# Altium footprint library custom.PcbLib: 330 footprints (part 15 of 21)
Each footprint in its own frame and in the unit in brackets; x right, y up, seen from the top. Pads: shape width x height; smd on the part's side, far side on the other; paste and mask are expansions set on the pad; w line width, h text height; cw(c..) or ccw(c..) is an arc to the next point about the centre after c.
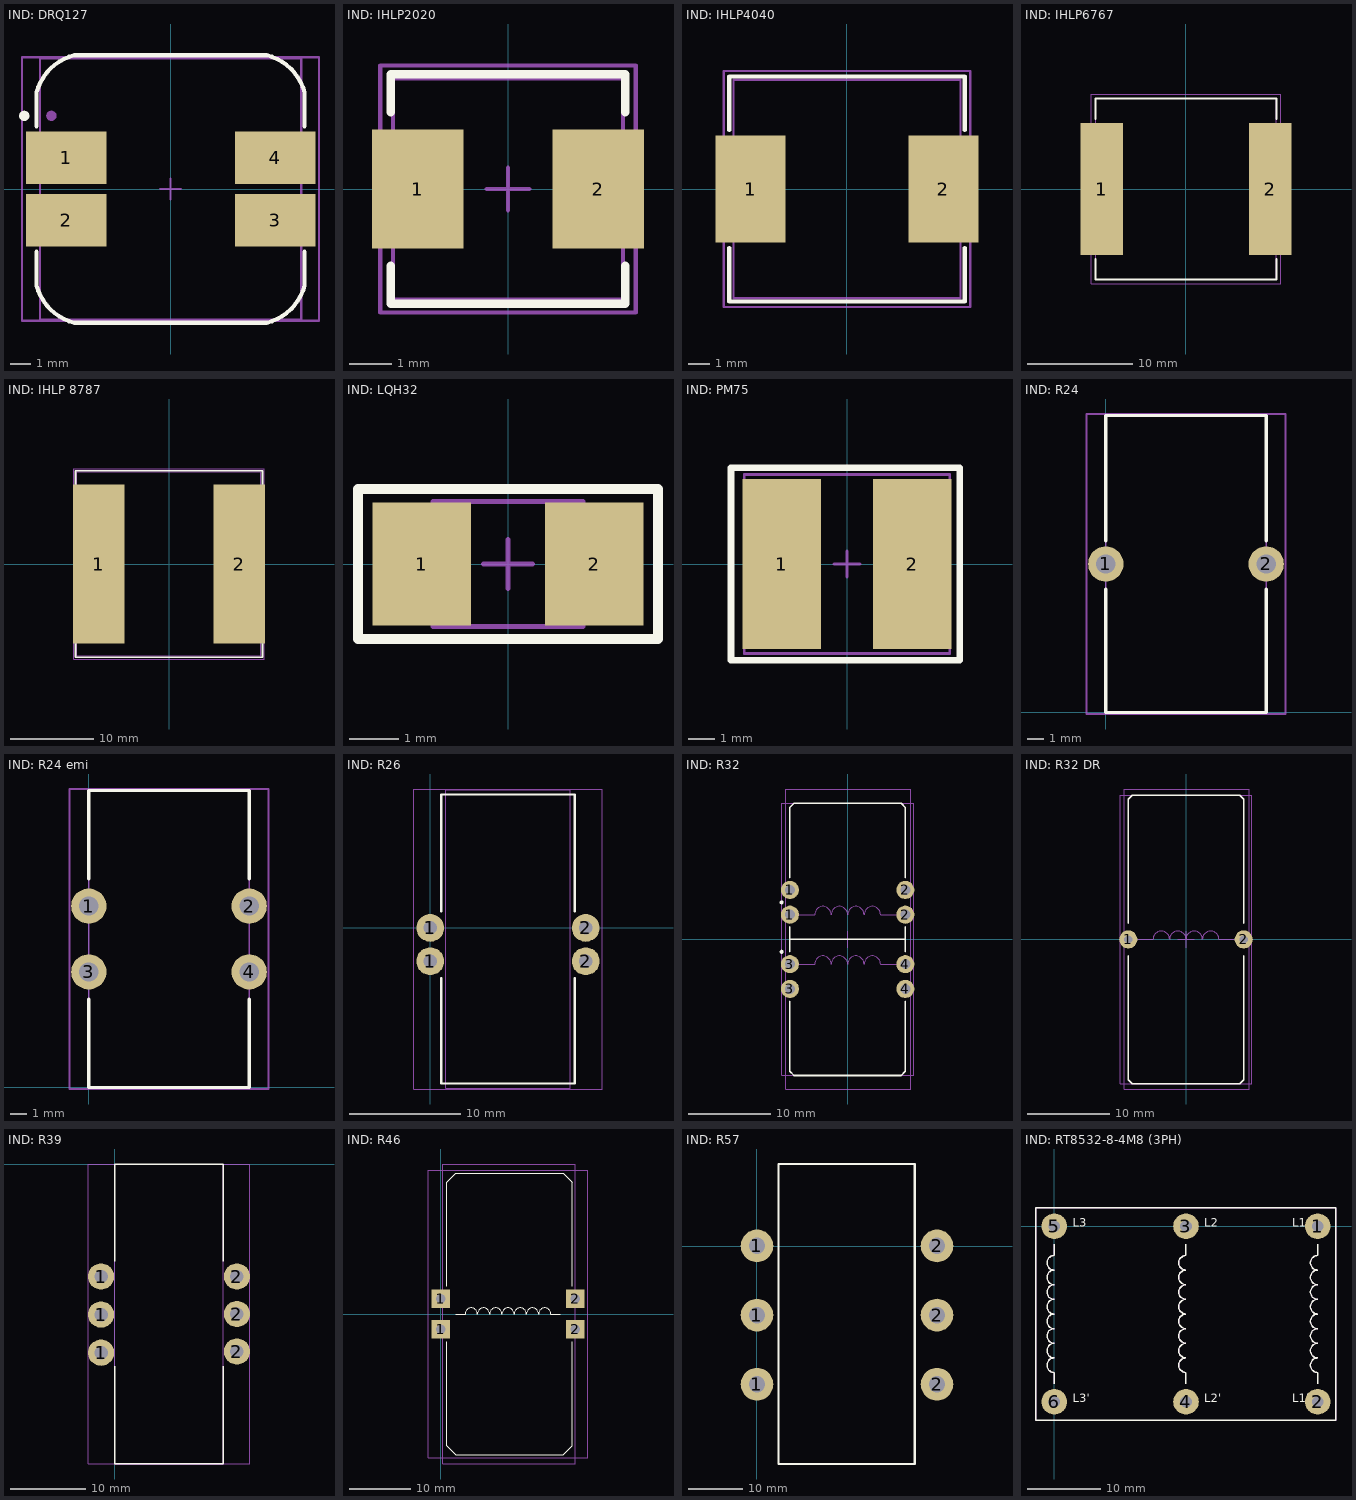
[diagram p14: the footprints below, top view; thin cyan lines are the x and y axes]

## IND: DRQ127 [mm] "Inductor"
height 5.1
pads (6):
  rect 3.85x2.5 smd: 1(-5,1.5) 2(-5,-1.5) 3(5,-1.5) 4(5,1.5)
  round 0.5 on Top Overlay: ""(-7,3.5)
  round 0.5 on Mech1: ""(-5.7,3.5)
Top Overlay:
  lines w0.2: -6.408,-3 -6.408,-4.625 ccw(c-3.994,-3.975) -4.6,-6.4 ; -6.408,3 -6.408,4.625 cw(c-3.994,3.975) -4.6,6.4 ; -4.606,-6.4 4.6,-6.4 ccw(c3.994,-3.975) 6.408,-4.625 6.408,-3 ; -4.606,6.4 4.6,6.4 cw(c3.994,3.975) 6.408,4.625 6.408,3
Top Assy:
  lines w0.1: -6.25,-6.25 -6.25,6.25 6.25,6.25 6.25,-6.25 -6.25,-6.25
Size Area:
  lines w0.1: -0.5,0 0.5,0 ; 0,-0.5 0,0.5 ; -7.1,-6.3 7.1,-6.3 7.1,6.3 -7.1,6.3 -7.1,-6.3
3D body "SW3dPS-DRQ127_12.5x12.5.STEP": height 8, standoff 0, extent -6.25,-6.25 6.25,6.25

## IND: IHLP2020 [mm] "SMD inductor, 5.2x5.2x3 mm"
height 3
pads (2):
  rect 2.15x2.8 smd: 1(-2.125,0) 2(2.125,0)
Top Overlay:
  lines w0.2: -2.75,-1.8 -2.75,-2.7 2.75,-2.7 2.75,-1.8 ; -2.75,1.8 -2.75,2.7 2.75,2.7 2.75,1.8
Top Assy:
  lines w0.1: -2.7,-2.6 2.7,-2.6 2.7,2.6 -2.7,2.6 -2.7,-2.6
Size Area:
  lines w0.1: -0.5,0 0.5,0 ; 0,-0.5 0,0.5 ; -3,-2.9 3,-2.9 3,2.9 -3,2.9 -3,-2.9
3D body "IHLP-2020.stp": height 2.89, standoff 0.03, extent -2.725,-2.571 2.725,2.575

## IND: IHLP4040 [mm] "SMD inductor, 10.3x10.8x4 mm"
height 4
pads (2):
  rect 3.25x5 smd: 1(-4.5,0) 2(4.5,0)
Top Overlay:
  lines w0.2: -5.5,-2.75 -5.5,-5.25 5.5,-5.25 5.5,-2.75 ; -5.5,2.75 -5.5,5.25 5.5,5.25 5.5,2.75
Top Assy:
  lines w0.1: -5.3,-5.1 -5.3,5.1 5.3,5.1 5.3,-5.1 -5.3,-5.1
Size Area:
  lines w0.1: -5.75,-5.5 -5.75,5.5 5.75,5.5 5.75,-5.5 -5.75,-5.5
3D body "IHLP-4040.stp": height 3.94, standoff 0.06, extent -5.311,-5.1 5.311,5.116

## IND: IHLP6767 [mm] "SMT inductor, 17x17x7 mm"
height 7
pads (2):
  rect 4x12.5 smd: 1(-8,0) 2(8,0)
Top Overlay:
  lines w0.2: -8.6,-6.65 -8.6,-8.6 8.6,-8.6 8.6,-6.65 ; -8.6,6.65 -8.6,8.6 8.6,8.6 8.6,6.65
Top Assy:
  lines w0.1: -8.588,-8.576 8.588,-8.576 8.588,8.6 -8.588,8.6 -8.588,-8.576
Size Area:
  lines w0.1: -9,-9 -9,9 9,9 9,-9 -9,-9
3D body "IHLP6767.stp": height 6.99, standoff 0.1, extent -8.588,-8.576 8.588,8.6

## IND: IHLP 8787 [mm] "SMT inductor, 22.5x22x13 mm"
height 13
pads (2):
  rect 6.25x19.25 smd: 1(-8.5,0) 2(8.5,0)
Top Overlay:
  lines w0.2: -11.3,-9.5 -11.3,-11.25 11.3,-11.25 11.3,-9.5 ; -11.3,9.5 -11.3,11.25 11.3,11.25 11.3,9.5
Top Assy:
  lines w0.1: -11.158,-11.112 -11.158,11.143 11.097,11.143 11.097,-11.112 -11.158,-11.112
Size Area:
  lines w0.1: -11.5,-11.5 -11.5,11.5 11.5,11.5 11.5,-11.5 -11.5,-11.5
3D body "IHLP8787MZ.STEP": height 12.9, standoff 0.02, extent -11.158,-11.112 11.097,11.143

## IND: LQH32 [mm]
height 4
pads (2):
  rect 2x2.5 smd: 1(-1.75,0) 2(1.75,0)
Top Overlay:
  lines w0.2: -3.048,-1.524 -3.048,1.524 3.048,1.524 3.048,-1.524 -3.048,-1.524
Top Assy:
  lines w0.1: -1.524,-1.27 1.524,-1.27 1.524,1.27 -1.524,1.27 -1.524,-1.27
Size Area:
  lines w0.1: -0.5,0 0.5,0 ; 0,-0.5 0,0.5 ; -3.048,-1.524 -3.048,1.524 3.048,1.524 3.048,-1.524 -3.048,-1.524
3D body "дроссель_смд_25_3.STEP": height 2.5, standoff 0, extent -1.5,-1.25 1.5,1.25

## IND: PM75 [mm]
height 15
pads (2):
  rect 3x6.5 smd: 1(-2.5,0) 2(2.5,0)
Top Overlay:
  lines w0.254: -4.445,-3.683 -4.445,3.683 4.318,3.683 4.318,-3.683 -4.445,-3.683
Top Assy:
  lines w0.1: -3.937,-3.429 -3.937,3.429 3.937,3.429 3.937,-3.429 -3.937,-3.429
Size Area:
  lines w0.05: -4.445,-3.683 4.318,-3.683 4.318,3.683 -4.445,3.683 -4.445,-3.683
  lines w0.1: -0.5,0 0.5,0 ; 0,-0.5 0,0.5
3D body "PM75 series bourns inductor.STEP": height 5, standoff 0, extent -3.868,-3.5 3.868,3.5

## IND: R24 [mm]
height 24
pads (2):
  round 2.2 hole 1.2: 1(0,9.25) 2(10,9.25)
Top Overlay:
  lines w0.2: 0,7.7 0,0 10,0 10,7.7 ; 0,10.7 0,18.5 10,18.5 10,10.7
Top Assy:
  lines w0.1: 10,18.5 10,0 0,0 0,18.5 10,18.5 ; 10,18.5 10,18.5
Size Area:
  lines w0.1: -1.2,-0.1 11.2,-0.1 11.2,18.6 -1.2,18.6 -1.2,-0.1
3D body "User Library-coilD17H9.STEP": height 18.25, standoff -3, extent 0,0 10,18.5

## IND: R24 emi [mm]
height 24
pads (4):
  round 2.2 hole 1.2: 1(0,11.3) 2(10,11.3) 3(0,7.2) 4(10,7.2)
Top Overlay:
  lines w0.2: 0,5.5 0,0 10,0 10,5.5 ; 0,13 0,18.5 10,18.5 10,13
Top Assy:
  lines w0.1: 10,18.5 0,18.5 0,0 10,0 10,18.5 ; 10,18.5 10,18.5
Size Area:
  lines w0.1: -1.2,-0.1 -1.2,18.6 11.2,18.6 11.2,-0.1 -1.2,-0.1
3D body "User Library-coilD17H9.STEP": height 18.25, standoff -3, extent 0,0 10,18.5

## IND: R26 [mm]
pads (4):
  round 2.5 hole 1.2: 1(0,-3) 1(0,0) 2(14,-3) 2(14,0)
Top Overlay:
  lines w0.2: 1,-4.5 1,-14 13,-14 13,-4.5 ; 1,1.5 1,12 13,12 13,1.5
Top Assy:
  lines w0.1: 1.39,-14.45 1.39,12.45 12.6,12.45 12.6,-14.45 1.39,-14.45
Size Area:
  lines w0.1: -1.5,-14.5 15.5,-14.5 15.5,12.5 -1.5,12.5 -1.5,-14.5
3D body "R26.14.11.stp": height 26.95, standoff 0.05, extent 1.39,-14.45 12.6,12.45

## IND: R32 [mm]
pads (10):
  round 2.2 hole 1.2: 1(-7,3) 1(-7,6) 2(7,3) 2(7,6) 3(-7,-6) 3(-7,-3) 4(7,-6) 4(7,-3)
  round 0.5 on Top Overlay: ""(-8,-1.5) ""(-8,4.5)
Top Overlay:
  lines w0.2: -7,-7.5 -7,-16 -6.5,-16.5 6.5,-16.5 7,-16 7,-7.5 ; -7,-1.5 -7,1.5 ; -7,0 7,0 ; -7,7.5 -7,16 -6.5,16.5 6.5,16.5 7,16 7,7.5 ; 7,-1.5 7,1.5
Top Assy:
  lines w0.1: -6,-3 -4,-3 cw(c-3,-3) -2,-3 cw(c-1,-3) 0,-3 cw(c1,-3) 2,-3 cw(c3,-3) 4,-3 6,-3 ; -6,3 -4,3 cw(c-3,3) -2,3 cw(c-1,3) 0,3 cw(c1,3) 2,3 cw(c3,3) 4,3 6,3 ; -7.493,-18.138 7.655,-18.138 7.655,18.241 -7.493,18.241 -7.493,-18.138
Size Area:
  lines w0.1: -1,0 1,0 ; 0,-1 0,1 ; -8,-16.5 7.5,-16.5 8,-16.5 8,16.5 -8,16.5 -8,-16.5
3D body "Дроссель R32.STEP": height 36.21, standoff 0.05, extent -7.493,-18.138 7.655,18.241

## IND: R32 DR [mm]
pads (2):
  round 2.2 hole 1: 1(-7,0) 2(7,0)
Top Overlay:
  lines w0.2: -7,-2 -7,-17 -6.5,-17.5 6.5,-17.5 7,-17 7,-2 ; -7,2 -7,17 -6.5,17.5 6.5,17.5 7,17 7,2
Top Assy:
  lines w0.1: -6,0 -4,0 cw(c-3,0) -2,0 cw(c-1,0) 0,0 cw(c1,0) 2,0 cw(c3,0) 4,0 6,0 ; -7.493,-18.138 -7.493,18.241 7.655,18.241 7.655,-18.138 -7.493,-18.138
Size Area:
  lines w0.1: -1,0 1,0 ; 0,-1 0,1 ; -8,-17.5 -8,17.5 8,17.5 8,-17.5 -8,-17.5
3D body "Дроссель R32.STEP": height 36.21, standoff 0.05, extent -7.493,-18.138 7.655,18.241

## IND: R39 [mm]
pads (6):
  round 3.5 hole 1.8: 1(-1.81,-25.16) 1(-1.81,-20.08) 1(-1.81,-15) 2(16.3,-25) 2(16.3,-20) 2(16.3,-15)
Top Overlay:
  lines w0.2: 0,-27 0,-40 14.5,-40 14.5,-27 ; 0,-13 0,0 14.5,0 14.5,-13
Top Assy:
  lines w0.1: 0,-40 14.5,-40 14.5,0 0,0 0,-40
Size Area:
  lines w0.1: -3.5,-40 18,-40 18,0 -3.5,0 -3.5,-40
3D body "R39.24.14.stp": height 39.99, standoff 0.01, extent 0,-40 14.5,0

## IND: R46 [mm]
pads (4):
  rect 3x3 hole 1.6: 1(0,-2.5) 1(0,2.5) 2(22,-2.5) 2(22,2.5)
Top Overlay:
  lines w0.2: 1,-4.5 1,-21.5 2.5,-23 20,-23 21.5,-21.5 21.5,-4.5 ; 1,4.5 1,21.5 2.5,23 20,23 21.5,21.5 21.5,4.5 ; 2.5,0 4,0 cw(c5,0) 6,0 cw(c7,0) 8,0 cw(c9,0) 10,0 cw(c11,0) 12,0 cw(c13,0) 14,0 cw(c15,0) 16,0 cw(c17,0) 18,0 19.5,0
Top Assy:
  lines w0.1: 0.369,-24.5 0.369,24.498 22,24.504 22,-24.5 0.369,-24.5
Size Area:
  lines w0.1: -2,-23.5 24,-23.5 24,23.5 -2,23.5 -2,-23.5
3D body "Сборка R46 (финал).STEP": height 48.95, standoff -0.24, extent 0.369,-24.506 22,24.506

## IND: R57 [mm]
pads (6):
  round 6 hole 3: 1(0.04,-25.36) 1(0.04,-12.66) 1(0.04,0.04) 2(33.1,-25.36) 2(33.1,-12.66) 2(33.1,0.04)
Top Overlay:
  lines w0.4: 4,-40 29,-40 29,12.58 29,15.08 4,15.08 4,12.58 4,-12.42 4,-40
Top Assy:
  lines w0.1: 4,-40 29,-40 29,15 4,15 4,-40
3D body "User Library-Toroid.STEP": height 60.5, standoff -0.5, extent 16.65,-43 29.35,18
3D body "User Library-Toroid.STEP": height 60.5, standoff -0.5, extent 4.1,-42.83 16.8,18.17

## IND: RT8532-8-4M8 (3PH) [mm]
pads (6):
  round 3.5 hole 1.6: 1(36,0) 2(36,-24) 3(18,0) 4(18,-24) 5(0,0) 6(0,-24)
Top Overlay:
  lines w0.2: 0,-21.5 0,-20 cw(c0,-19) 0,-18 cw(c0,-17) 0,-16 cw(c0,-15) 0,-14 cw(c0,-13) 0,-12 cw(c0,-11) 0,-10 cw(c0,-9) 0,-8 cw(c0,-7) 0,-6 cw(c0,-5) 0,-4 0,-2.5 ; 18,-21.5 18,-20 cw(c18,-19) 18,-18 cw(c18,-17) 18,-16 cw(c18,-15) 18,-14 cw(c18,-13) 18,-12 cw(c18,-11) 18,-10 cw(c18,-9) 18,-8 cw(c18,-7) 18,-6 cw(c18,-5) 18,-4 18,-2.5 ; 36,-21.5 36,-20 cw(c36,-19) 36,-18 cw(c36,-17) 36,-16 cw(c36,-15) 36,-14 cw(c36,-13) 36,-12 cw(c36,-11) 36,-10 cw(c36,-9) 36,-8 cw(c36,-7) 36,-6 cw(c36,-5) 36,-4 36,-2.5 ; -2.5,-26.5 38.5,-26.5 38.5,2.5 -2.5,2.5 -2.5,-26.5
  text "L1'" at 32.5,-24.5 h2
  text "L1" at 32.5,-0.5 h2
  text "L2'" at 20.5,-24.5 h2
  text "L2" at 20.5,-0.5 h2
  text "L3'" at 2.5,-24.5 h2
  text "L3" at 2.5,-0.5 h2
Top Assy:
  lines w0.1: 0,-21.5 0,-20 cw(c0,-19) 0,-18 cw(c0,-17) 0,-16 cw(c0,-15) 0,-14 cw(c0,-13) 0,-12 cw(c0,-11) 0,-10 cw(c0,-9) 0,-8 cw(c0,-7) 0,-6 cw(c0,-5) 0,-4 0,-2.5 ; 18,-21.5 18,-20 cw(c18,-19) 18,-18 cw(c18,-17) 18,-16 cw(c18,-15) 18,-14 cw(c18,-13) 18,-12 cw(c18,-11) 18,-10 cw(c18,-9) 18,-8 cw(c18,-7) 18,-6 cw(c18,-5) 18,-4 18,-2.5 ; 36,-21.5 36,-20 cw(c36,-19) 36,-18 cw(c36,-17) 36,-16 cw(c36,-15) 36,-14 cw(c36,-13) 36,-12 cw(c36,-11) 36,-10 cw(c36,-9) 36,-8 cw(c36,-7) 36,-6 cw(c36,-5) 36,-4 36,-2.5 ; -2.5,-26.5 38.5,-26.5 38.5,2.5 -2.5,2.5 -2.5,-26.5
  text "L3'" at 2.5,-24.5 h2
  text "L3" at 2.5,-0.5 h2
  text "L2'" at 20.5,-24.5 h2
  text "L2" at 20.5,-0.5 h2
  text "L1'" at 32.5,-24.5 h2
  text "L1" at 32.5,-0.5 h2
Size Area:
  lines w0.1: -2.5,-26.5 38.5,-26.5 38.5,2.5 -2.5,2.5 -2.5,-26.5
3D body "RT8532-8-4M8.STEP": height 43.97, standoff -4, extent -2.5,-26.5 38.5,2.5